# Altium integrated library Microchip Mixed Signal.IntLib: 1399 symbols (part 3 of 17)
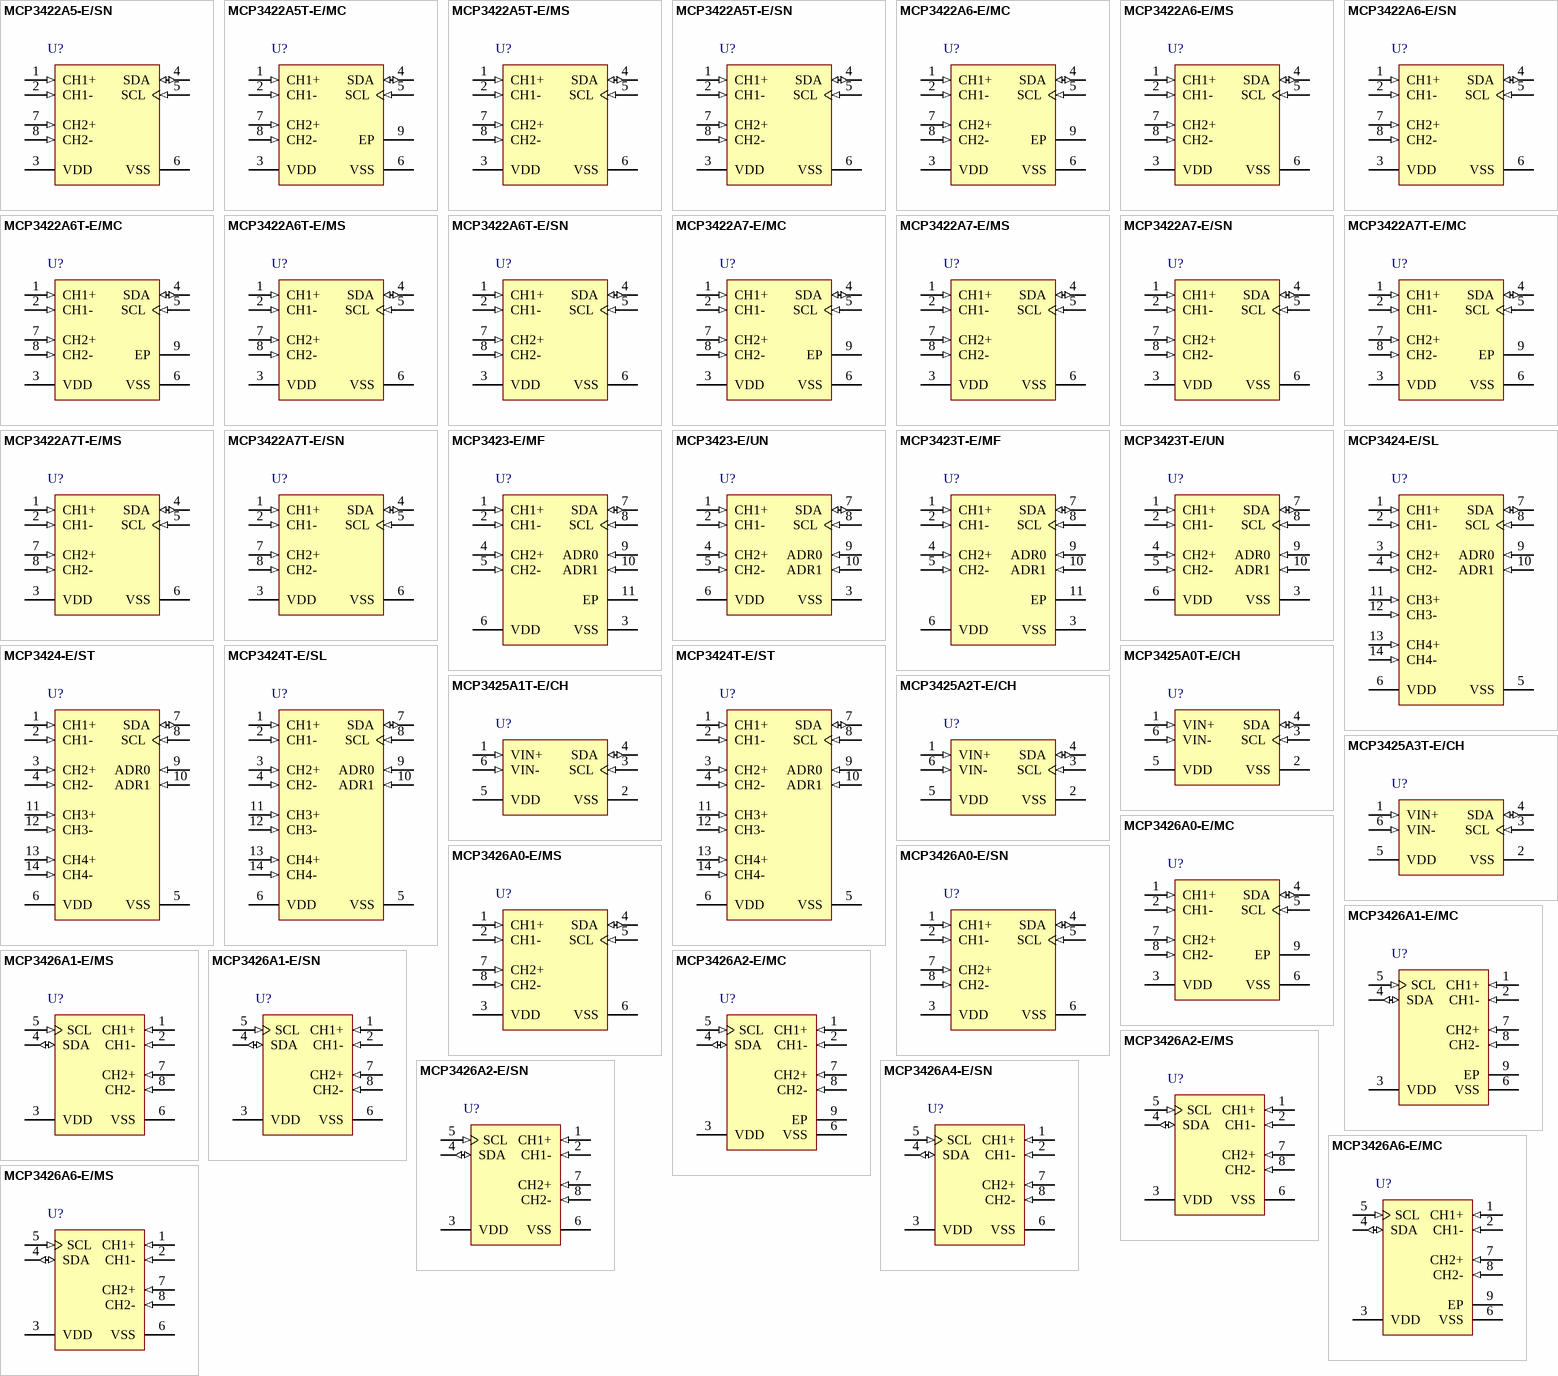
[diagram p46: symbols MCP3422A5-E/SN to MCP3426A6-E/MS]

## MCP3426A0-E/MS
designator U?
16-Bit, Multi-Channel Delta-Sigma Analog-to-Digital Converter with I2C Interface and On-Board Reference, 8-Pin MSOP, Extended Temperature; Manufacturer: Microchip; PartNumber: MCP3426A0-E/MS; DatasheetVersion: revA, Dec-2009; PackageVersion: revBB, Aug-2009; PackageReference: MSOP-MS8; PackageDescription: 8-Lead Plastic Micro Small Outline Package (MS) [MSOP]; Supplier 1: Digi-Key; Supplier Part Number 1: MCP3426A0-E/MS-ND; Mounting Technology: Surface Mount; ComponentLink1Description: Manufacturer URL; ComponentLink1URL: http://www.microchip.com/; ComponentLink2Description: Datasheet; ComponentLink2URL: http://ww1.microchip.com/downloads/en/DeviceDoc/22226a.pdf; ComponentLink3Description: Package Specification; ComponentLink3URL: http://www.microchip.com/stellent/groups/techpub_sg/documents/packagingspec/en012702.pdf
footprint MSOP-MS8_N (TSOP, 8-Leads, Body 3x3mm, Pitch 0.65mm, IPC Medium Density)
footprint MSOP-MS8_L (TSOP, 8-Leads, Body 3x3mm, Pitch 0.65mm, IPC High Density)
footprint MSOP-MS8_M (TSOP, 8-Leads, Body 3x3mm, Pitch 0.65mm, IPC Low Density)
pins: 1 CH1+ (in), 2 CH1- (in), 3 VDD (power), 4 SDA (io), 5 SCL (in), 6 VSS (power), 7 CH2+ (in), 8 CH2- (in)

## MCP3426A0-E/SN
designator U?
16-Bit, Multi-Channel Delta-Sigma Analog-to-Digital Converter with I2C Interface and On-Board Reference, 8-Pin SOIC 150mil, Extended Temperature; Manufacturer: Microchip; PartNumber: MCP3426A0-E/SN; DatasheetVersion: revA, Dec-2009; PackageVersion: revBB, Aug-2009; PackageReference: SOIC-SN8; PackageDescription: 8-Lead Plastic Small Outline (SN) - Narrow, 3.90mm Body [SOIC]; Supplier 1: Digi-Key; Supplier Part Number 1: MCP3426A0-E/SN-ND; Mounting Technology: Surface Mount; Code_JEDEC: MS-012; Code_IPC: SOIC127P600-8; ComponentLink1Description: Manufacturer URL; ComponentLink1URL: http://www.microchip.com/; ComponentLink2Description: Datasheet; ComponentLink2URL: http://ww1.microchip.com/downloads/en/DeviceDoc/22226a.pdf; ComponentLink3Description: Package Specification; ComponentLink3URL: http://www.microchip.com/stellent/groups/techpub_sg/documents/packagingspec/en012702.pdf
footprint SOIC-SN8_N (SOIC, 8-Leads, Body 4.9x3.8mm, Pitch 1.27mm, IPC Medium Density)
footprint SOIC-SN8_L (SOIC, 8-Leads, Body 4.9x3.8mm, Pitch 1.27mm, IPC High Density)
footprint SOIC-SN8_M (SOIC, 8-Leads, Body 4.9x3.8mm, Pitch 1.27mm, IPC Low Density)
pins: 1 CH1+ (in), 2 CH1- (in), 3 VDD (power), 4 SDA (io), 5 SCL (in), 6 VSS (power), 7 CH2+ (in), 8 CH2- (in)

## MCP3426A1-E/MC
designator U?
16-Bit, Multi-Channel delta sigma Analog-to-Digital Converter with I2C™ Interface and On-Board Reference, 145 uA, 2.7 to 5.5 V, -40 to 125 degC, 8-pin DFN (MC8), Tube; Manufacturer: Microchip; PartNumber: MCP3426A1-E/MC; DatasheetVersion: Rev. A; PackageVersion: C04-123C; PackageReference: DFN-MC8; PackageDescription: 8-Lead Plastic Dual Flat, 2 x 3 mm Body, 0.5 mm Pitch; Supplier 1: Digi-Key; Supplier Part Number 1: MCP3426A1-E/MC-ND; Mounting Technology: Surface Mount; ComponentLink1Description: Manufacturer URL; ComponentLink1URL: http://www.microchip.com; ComponentLink2Description: Datasheet; ComponentLink2URL: http://ww1.microchip.com/downloads/en/DeviceDoc/22226a.pdf; ComponentLink3Description: Package Specification; ComponentLink3URL: http://www.microchip.com/stellent/groups/techpub_sg/documents/packagingspec/en012702.pdf; ComponentLink4Description: Product URL; ComponentLink4URL: http://www.microchip.com/MCP3426
footprint MCHP-DFN-MC8_V (SON, 8-Leads, Body 3x2mm, Pitch 0.5mm, Thermal Pad 1.45x1.75mm)
pins: 1 CH1+ (in) "Positive Differential Analog Input Pin of Channel 1", 2 CH1- (in) "Negative Differential Analog Input Pin of Channel 1", 3 VDD (power) "Positive Supply Voltage Pin", 4 SDA (io) "Bidirectional Serial Data Pin of the I2C Interface", 5 SCL (in) "Serial Clock Pin of the I2C Interface", 6 VSS (power) "Ground Pin", 7 CH2+ (in) "Positive Differential Analog Input Pin of Channel 2", 8 CH2- (in) "Negative Differential Analog Input Pin of Channel 2", 9 EP (power) "Exposed Thermal Pad (EP); must be connected to VSS"

## MCP3426A1-E/MS
designator U?
16-Bit, Multi-Channel sigma delta Analog-to-Digital Converter with I2C™ Interface and On-Board Reference, 145 uA, 2.7 to 5.5 V, -40 to 125 degC, 8-pin MSOP (MS8), Tube; Manufacturer: Microchip; PartNumber: MCP3426A1-E/MS; DatasheetVersion: Rev. A; PackageVersion: C04-111C; PackageReference: MSOP-MS8; PackageDescription: 8-Lead Plastic Micro Small Outline Package, 3 x 3 mm Body, 0.65 mm Pitch; Supplier 1: Digi-Key; Supplier Part Number 1: MCP3426A1-E/MS-ND; Mounting Technology: Surface Mount; ComponentLink1Description: Manufacturer URL; ComponentLink1URL: http://www.microchip.com; ComponentLink2Description: Datasheet; ComponentLink2URL: http://ww1.microchip.com/downloads/en/DeviceDoc/22226a.pdf; ComponentLink3Description: Package Specification; ComponentLink3URL: http://www.microchip.com/stellent/groups/techpub_sg/documents/packagingspec/en012702.pdf; ComponentLink4Description: Product URL; ComponentLink4URL: http://www.microchip.com/MCP3426
footprint MCHP-MSOP-MS8_N (SOP, 8-Leads, Body 3x3mm, Pitch 0.65mm, IPC Medium Density)
footprint MCHP-MSOP-MS8_L (SOP, 8-Leads, Body 3x3mm, Pitch 0.65mm, IPC High Density)
footprint MCHP-MSOP-MS8_M (SOP, 8-Leads, Body 3x3mm, Pitch 0.65mm, IPC Low Density)
pins: 1 CH1+ (in) "Positive Differential Analog Input Pin of Channel 1", 2 CH1- (in) "Negative Differential Analog Input Pin of Channel 1", 3 VDD (power) "Positive Supply Voltage Pin", 4 SDA (io) "Bidirectional Serial Data Pin of the I2C Interface", 5 SCL (in) "Serial Clock Pin of the I2C Interface", 6 VSS (power) "Ground Pin", 7 CH2+ (in) "Positive Differential Analog Input Pin of Channel 2", 8 CH2- (in) "Negative Differential Analog Input Pin of Channel 2"

## MCP3426A1-E/SN
designator U?
16-Bit, Multi-Channel sigma delta Analog-to-Digital Converter with I2C™ Interface and On-Board Reference, 145 uA, 2.7 to 5.5 V, -40 to 125 degC, 8-pin SOIC (SN8), Tube; Manufacturer: Microchip; PartNumber: MCP3426A1-E/SN; DatasheetVersion: Rev. A; PackageVersion: C04-057C; PackageReference: SOIC-SN8; PackageDescription: 8-Lead Plastic Small Outline, 4.9 x 3.9 mm Body, 1.27 mm Pitch; Supplier 1: Digi-Key; Supplier Part Number 1: MCP3426A1-E/SN-ND; Mounting Technology: Surface Mount; ComponentLink1Description: Manufacturer URL; ComponentLink1URL: http://www.microchip.com; ComponentLink2Description: Datasheet; ComponentLink2URL: http://ww1.microchip.com/downloads/en/DeviceDoc/22226a.pdf; ComponentLink3Description: Package Specification; ComponentLink3URL: http://www.microchip.com/stellent/groups/techpub_sg/documents/packagingspec/en012702.pdf; ComponentLink4Description: Product URL; ComponentLink4URL: http://www.microchip.com/MCP3426
footprint MCHP-SOIC-SN8_N (SOIC, 8-Leads, Body 4.9x3.9mm, Pitch 1.27mm, IPC Medium Density)
footprint MCHP-SOIC-SN8_L (SOIC, 8-Leads, Body 4.9x3.9mm, Pitch 1.27mm, IPC High Density)
footprint MCHP-SOIC-SN8_M (SOIC, 8-Leads, Body 4.9x3.9mm, Pitch 1.27mm, IPC Low Density)
pins: 1 CH1+ (in) "Positive Differential Analog Input Pin of Channel 1", 2 CH1- (in) "Negative Differential Analog Input Pin of Channel 1", 3 VDD (power) "Positive Supply Voltage Pin", 4 SDA (io) "Bidirectional Serial Data Pin of the I2C Interface", 5 SCL (in) "Serial Clock Pin of the I2C Interface", 6 VSS (power) "Ground Pin", 7 CH2+ (in) "Positive Differential Analog Input Pin of Channel 2", 8 CH2- (in) "Negative Differential Analog Input Pin of Channel 2"

## MCP3426A2-E/MC
designator U?
16-Bit, Multi-Channel sigma delta Analog-to-Digital Converter with I2C™ Interface and On-Board Reference, 145 uA, 2.7 to 5.5 V, -40 to 125 degC, 8-pin DFN (MC8), Tube; Manufacturer: Microchip; PartNumber: MCP3426A2-E/MC; DatasheetVersion: Rev. A; PackageVersion: C04-123C; PackageReference: DFN-MC8; PackageDescription: 8-Lead Plastic Dual Flat, 2 x 3 mm Body, 0.5 mm Pitch; Supplier 1: Digi-Key; Supplier Part Number 1: MCP3426A2-E/MC-ND; Mounting Technology: Surface Mount; ComponentLink1Description: Manufacturer URL; ComponentLink1URL: http://www.microchip.com; ComponentLink2Description: Datasheet; ComponentLink2URL: http://ww1.microchip.com/downloads/en/DeviceDoc/22226a.pdf; ComponentLink3Description: Package Specification; ComponentLink3URL: http://www.microchip.com/stellent/groups/techpub_sg/documents/packagingspec/en012702.pdf; ComponentLink4Description: Product URL; ComponentLink4URL: http://www.microchip.com/MCP3426
footprint MCHP-DFN-MC8_V (SON, 8-Leads, Body 3x2mm, Pitch 0.5mm, Thermal Pad 1.45x1.75mm)
pins: 1 CH1+ (in) "Positive Differential Analog Input Pin of Channel 1", 2 CH1- (in) "Negative Differential Analog Input Pin of Channel 1", 3 VDD (power) "Positive Supply Voltage Pin", 4 SDA (io) "Bidirectional Serial Data Pin of the I2C Interface", 5 SCL (in) "Serial Clock Pin of the I2C Interface", 6 VSS (power) "Ground Pin", 7 CH2+ (in) "Positive Differential Analog Input Pin of Channel 2", 8 CH2- (in) "Negative Differential Analog Input Pin of Channel 2", 9 EP (power) "Exposed Thermal Pad (EP); must be connected to VSS"

## MCP3426A2-E/MS
designator U?
16-Bit, Multi-Channel sigma delta Analog-to-Digital Converter with I2C™ Interface and On-Board Reference, 145 uA, 2.7 to 5.5 V, -40 to 125 degC, 8-pin MSOP (MS8), Tube; Manufacturer: Microchip; PartNumber: MCP3426A2-E/MS; DatasheetVersion: Rev. A; PackageVersion: C04-111C; PackageReference: MSOP-MS8; PackageDescription: 8-Lead Plastic Micro Small Outline Package, 3 x 3 mm Body, 0.65 mm Pitch; Supplier 1: Digi-Key; Supplier Part Number 1: MCP3426A2-E/MS-ND; Mounting Technology: Surface Mount; ComponentLink1Description: Manufacturer URL; ComponentLink1URL: http://www.microchip.com; ComponentLink2Description: Datasheet; ComponentLink2URL: http://ww1.microchip.com/downloads/en/DeviceDoc/22226a.pdf; ComponentLink3Description: Package Specification; ComponentLink3URL: http://www.microchip.com/stellent/groups/techpub_sg/documents/packagingspec/en012702.pdf; ComponentLink4Description: Product URL; ComponentLink4URL: http://www.microchip.com/MCP3426
footprint MCHP-MSOP-MS8_N (SOP, 8-Leads, Body 3x3mm, Pitch 0.65mm, IPC Medium Density)
footprint MCHP-MSOP-MS8_L (SOP, 8-Leads, Body 3x3mm, Pitch 0.65mm, IPC High Density)
footprint MCHP-MSOP-MS8_M (SOP, 8-Leads, Body 3x3mm, Pitch 0.65mm, IPC Low Density)
pins: 1 CH1+ (in) "Positive Differential Analog Input Pin of Channel 1", 2 CH1- (in) "Negative Differential Analog Input Pin of Channel 1", 3 VDD (power) "Positive Supply Voltage Pin", 4 SDA (io) "Bidirectional Serial Data Pin of the I2C Interface", 5 SCL (in) "Serial Clock Pin of the I2C Interface", 6 VSS (power) "Ground Pin", 7 CH2+ (in) "Positive Differential Analog Input Pin of Channel 2", 8 CH2- (in) "Negative Differential Analog Input Pin of Channel 2"

## MCP3426A2-E/SN
designator U?
16-Bit, Multi-Channel sigma delta Analog-to-Digital Converter with I2C™ Interface and On-Board Reference, 145 uA, 2.7 to 5.5 V, -40 to 125 degC, 8-pin SOIC (SN8), Tube; Manufacturer: Microchip; PartNumber: MCP3426A2-E/SN; DatasheetVersion: Rev. A; PackageVersion: C04-057C; PackageReference: SOIC-SN8; PackageDescription: 8-Lead Plastic Small Outline, 4.9 x 3.9 mm Body, 1.27 mm Pitch; Supplier 1: Digi-Key; Supplier Part Number 1: MCP3426A2-E/SN-ND; Mounting Technology: Surface Mount; ComponentLink1Description: Manufacturer URL; ComponentLink1URL: http://www.microchip.com; ComponentLink2Description: Datasheet; ComponentLink2URL: http://ww1.microchip.com/downloads/en/DeviceDoc/22226a.pdf; ComponentLink3Description: Package Specification; ComponentLink3URL: http://www.microchip.com/stellent/groups/techpub_sg/documents/packagingspec/en012702.pdf; ComponentLink4Description: Product URL; ComponentLink4URL: http://www.microchip.com/MCP3426
footprint MCHP-SOIC-SN8_N (SOIC, 8-Leads, Body 4.9x3.9mm, Pitch 1.27mm, IPC Medium Density)
footprint MCHP-SOIC-SN8_L (SOIC, 8-Leads, Body 4.9x3.9mm, Pitch 1.27mm, IPC High Density)
footprint MCHP-SOIC-SN8_M (SOIC, 8-Leads, Body 4.9x3.9mm, Pitch 1.27mm, IPC Low Density)
pins: 1 CH1+ (in) "Positive Differential Analog Input Pin of Channel 1", 2 CH1- (in) "Negative Differential Analog Input Pin of Channel 1", 3 VDD (power) "Positive Supply Voltage Pin", 4 SDA (io) "Bidirectional Serial Data Pin of the I2C Interface", 5 SCL (in) "Serial Clock Pin of the I2C Interface", 6 VSS (power) "Ground Pin", 7 CH2+ (in) "Positive Differential Analog Input Pin of Channel 2", 8 CH2- (in) "Negative Differential Analog Input Pin of Channel 2"

## MCP3426A4-E/SN
designator U?
16-Bit, Multi-Channel sigma delta Analog-to-Digital Converter with I2C™ Interface and On-Board Reference, 145 uA, 2.7 to 5.5 V, -40 to 125 degC, 8-pin SOIC (SN8), Tube; Manufacturer: Microchip; PartNumber: MCP3426A4-E/SN; DatasheetVersion: Rev. A; PackageVersion: C04-057C; PackageReference: SOIC-SN8; PackageDescription: 8-Lead Plastic Small Outline, 4.9 x 3.9 mm Body, 1.27 mm Pitch; Supplier 1: Digi-Key; Supplier Part Number 1: MCP3426A4-E/SN-ND; Mounting Technology: Surface Mount; ComponentLink1Description: Manufacturer URL; ComponentLink1URL: http://www.microchip.com; ComponentLink2Description: Datasheet; ComponentLink2URL: http://ww1.microchip.com/downloads/en/DeviceDoc/22226a.pdf; ComponentLink3Description: Package Specification; ComponentLink3URL: http://www.microchip.com/stellent/groups/techpub_sg/documents/packagingspec/en012702.pdf; ComponentLink4Description: Product URL; ComponentLink4URL: http://www.microchip.com/MCP3426
footprint MCHP-SOIC-SN8_N (SOIC, 8-Leads, Body 4.9x3.9mm, Pitch 1.27mm, IPC Medium Density)
footprint MCHP-SOIC-SN8_L (SOIC, 8-Leads, Body 4.9x3.9mm, Pitch 1.27mm, IPC High Density)
footprint MCHP-SOIC-SN8_M (SOIC, 8-Leads, Body 4.9x3.9mm, Pitch 1.27mm, IPC Low Density)
pins: 1 CH1+ (in) "Positive Differential Analog Input Pin of Channel 1", 2 CH1- (in) "Negative Differential Analog Input Pin of Channel 1", 3 VDD (power) "Positive Supply Voltage Pin", 4 SDA (io) "Bidirectional Serial Data Pin of the I2C Interface", 5 SCL (in) "Serial Clock Pin of the I2C Interface", 6 VSS (power) "Ground Pin", 7 CH2+ (in) "Positive Differential Analog Input Pin of Channel 2", 8 CH2- (in) "Negative Differential Analog Input Pin of Channel 2"

## MCP3426A6-E/MC
designator U?
16-Bit, Multi-Channel sigma delta Analog-to-Digital Converter with I2C™ Interface and On-Board Reference, 145 uA, 2.7 to 5.5 V, -40 to 125 degC, 8-pin DFN (MC8), Tube; Manufacturer: Microchip; PartNumber: MCP3426A6-E/MC; DatasheetVersion: Rev. A; PackageVersion: C04-123C; PackageReference: DFN-MC8; PackageDescription: 8-Lead Plastic Dual Flat, 2 x 3 mm Body, 0.5 mm Pitch; Supplier 1: Digi-Key; Supplier Part Number 1: MCP3426A6-E/MC-ND; Mounting Technology: Surface Mount; ComponentLink1Description: Manufacturer URL; ComponentLink1URL: http://www.microchip.com; ComponentLink2Description: Datasheet; ComponentLink2URL: http://ww1.microchip.com/downloads/en/DeviceDoc/22226a.pdf; ComponentLink3Description: Package Specification; ComponentLink3URL: http://www.microchip.com/stellent/groups/techpub_sg/documents/packagingspec/en012702.pdf; ComponentLink4Description: Product URL; ComponentLink4URL: http://www.microchip.com/MCP3426
footprint MCHP-DFN-MC8_V (SON, 8-Leads, Body 3x2mm, Pitch 0.5mm, Thermal Pad 1.45x1.75mm)
pins: 1 CH1+ (in) "Positive Differential Analog Input Pin of Channel 1", 2 CH1- (in) "Negative Differential Analog Input Pin of Channel 1", 3 VDD (power) "Positive Supply Voltage Pin", 4 SDA (io) "Bidirectional Serial Data Pin of the I2C Interface", 5 SCL (in) "Serial Clock Pin of the I2C Interface", 6 VSS (power) "Ground Pin", 7 CH2+ (in) "Positive Differential Analog Input Pin of Channel 2", 8 CH2- (in) "Negative Differential Analog Input Pin of Channel 2", 9 EP (power) "Exposed Thermal Pad (EP); must be connected to VSS"

## MCP3426A6-E/MS
designator U?
16-Bit, Multi-Channel sigma delta Analog-to-Digital Converter with I2C™ Interface and On-Board Reference, 145 uA, 2.7 to 5.5 V, -40 to 125 degC, 8-pin MSOP (MS8), Tube; Manufacturer: Microchip; PartNumber: MCP3426A6-E/MS; DatasheetVersion: Rev. A; PackageVersion: C04-111C; PackageReference: MSOP-MS8; PackageDescription: 8-Lead Plastic Micro Small Outline Package, 3 x 3 mm Body, 0.65 mm Pitch; Supplier 1: Digi-Key; Supplier Part Number 1: MCP3426A6-E/MS-ND; Mounting Technology: Surface Mount; ComponentLink1Description: Manufacturer URL; ComponentLink1URL: http://www.microchip.com; ComponentLink2Description: Datasheet; ComponentLink2URL: http://ww1.microchip.com/downloads/en/DeviceDoc/22226a.pdf; ComponentLink3Description: Package Specification; ComponentLink3URL: http://www.microchip.com/stellent/groups/techpub_sg/documents/packagingspec/en012702.pdf; ComponentLink4Description: Product URL; ComponentLink4URL: http://www.microchip.com/MCP3426
footprint MCHP-MSOP-MS8_N (SOP, 8-Leads, Body 3x3mm, Pitch 0.65mm, IPC Medium Density)
footprint MCHP-MSOP-MS8_L (SOP, 8-Leads, Body 3x3mm, Pitch 0.65mm, IPC High Density)
footprint MCHP-MSOP-MS8_M (SOP, 8-Leads, Body 3x3mm, Pitch 0.65mm, IPC Low Density)
pins: 1 CH1+ (in) "Positive Differential Analog Input Pin of Channel 1", 2 CH1- (in) "Negative Differential Analog Input Pin of Channel 1", 3 VDD (power) "Positive Supply Voltage Pin", 4 SDA (io) "Bidirectional Serial Data Pin of the I2C Interface", 5 SCL (in) "Serial Clock Pin of the I2C Interface", 6 VSS (power) "Ground Pin", 7 CH2+ (in) "Positive Differential Analog Input Pin of Channel 2", 8 CH2- (in) "Negative Differential Analog Input Pin of Channel 2"

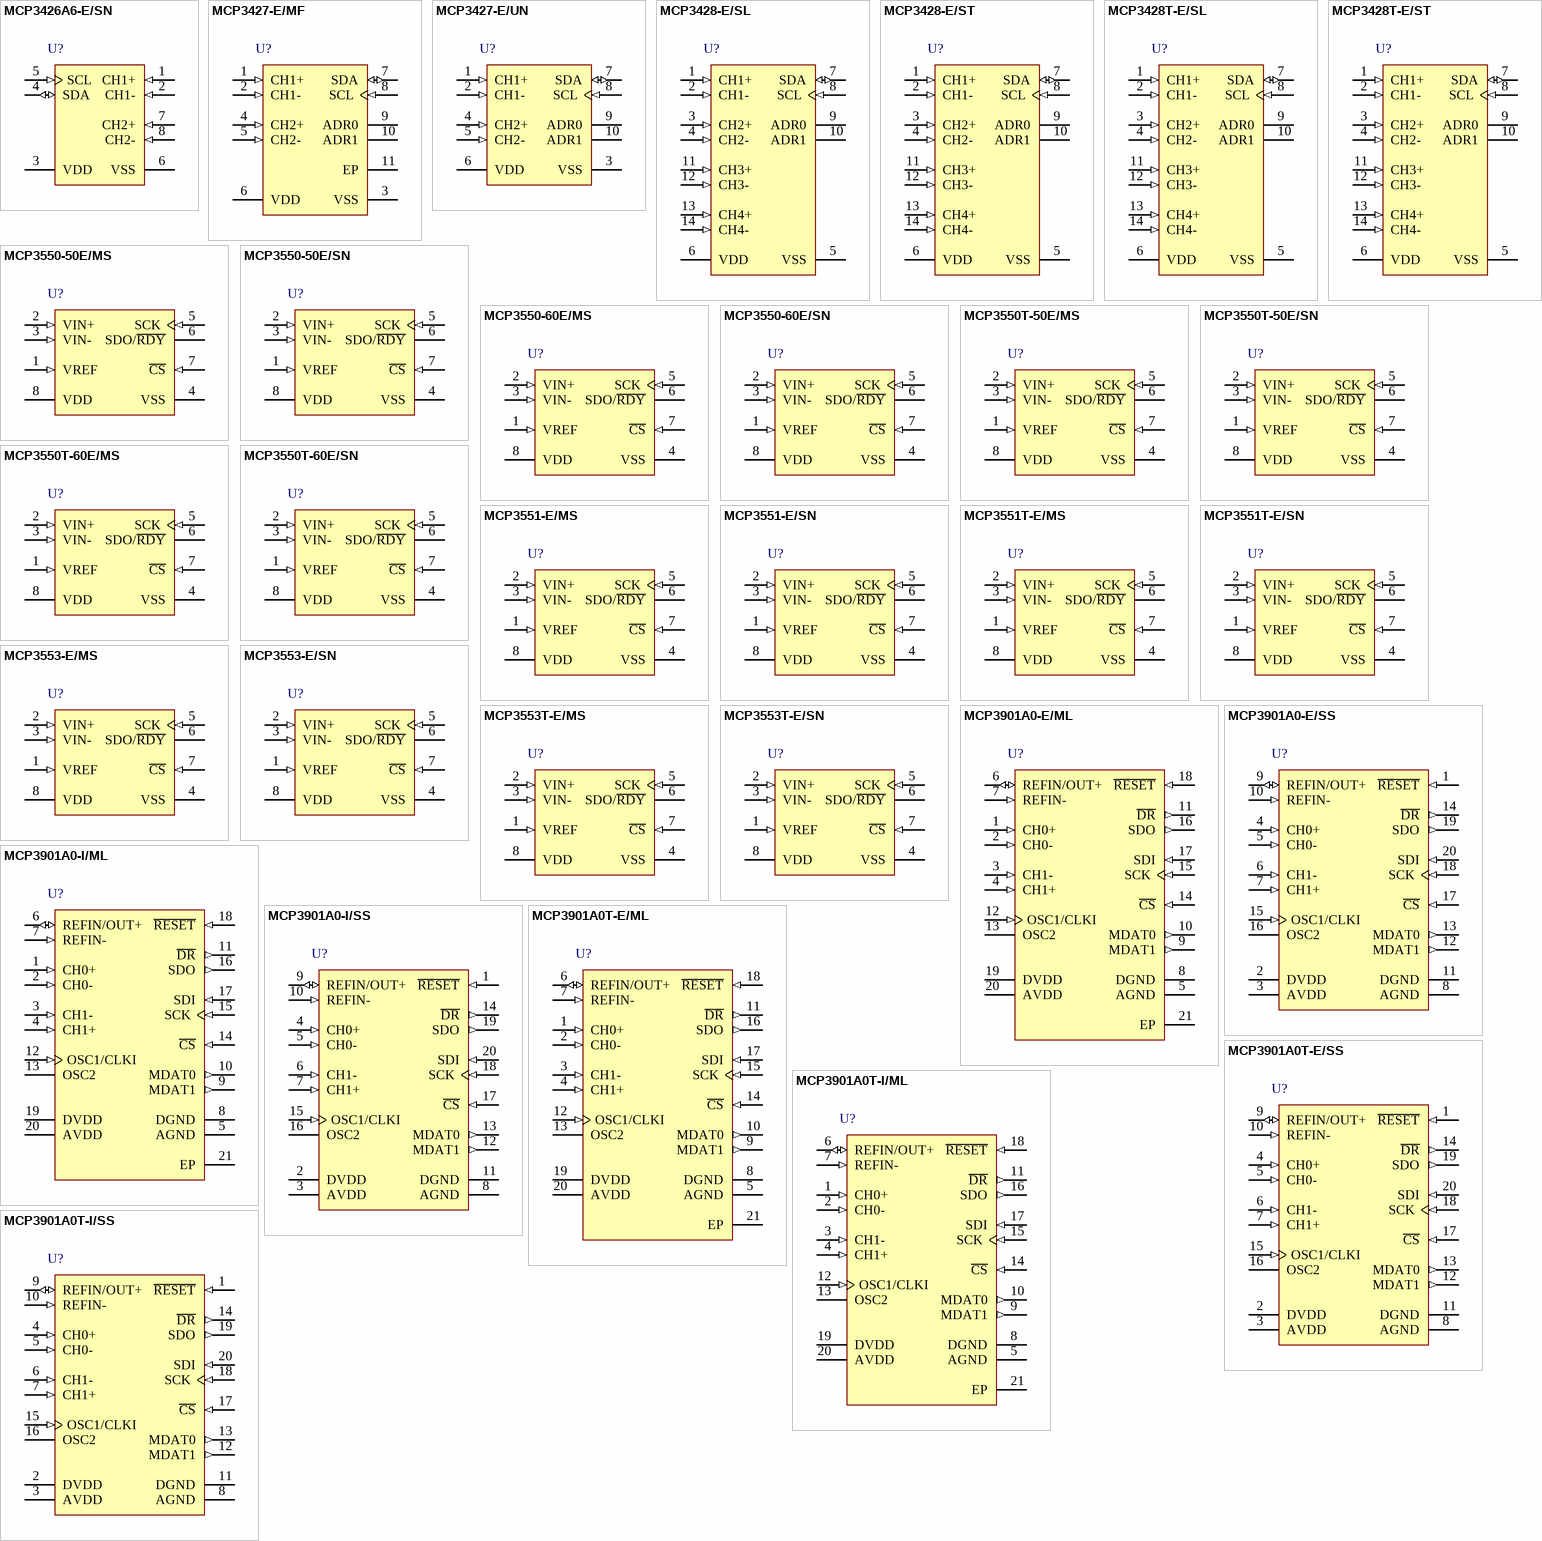
[diagram p5: symbols MCP3426A6-E/SN to MCP3901A0T-I/SS]

## MCP3426A6-E/SN
designator U?
16-Bit, Multi-Channel sigma delta Analog-to-Digital Converter with I2C™ Interface and On-Board Reference, 145 uA, 2.7 to 5.5 V, -40 to 125 degC, 8-pin SOIC (SN8), Tube; Manufacturer: Microchip; PartNumber: MCP3426A6-E/SN; DatasheetVersion: Rev. A; PackageVersion: C04-057C; PackageReference: SOIC-SN8; PackageDescription: 8-Lead Plastic Small Outline, 4.9 x 3.9 mm Body, 1.27 mm Pitch; Supplier 1: Digi-Key; Supplier Part Number 1: MCP3426A6-E/SN-ND; Mounting Technology: Surface Mount; ComponentLink1Description: Manufacturer URL; ComponentLink1URL: http://www.microchip.com; ComponentLink2Description: Datasheet; ComponentLink2URL: http://ww1.microchip.com/downloads/en/DeviceDoc/22226a.pdf; ComponentLink3Description: Package Specification; ComponentLink3URL: http://www.microchip.com/stellent/groups/techpub_sg/documents/packagingspec/en012702.pdf; ComponentLink4Description: Product URL; ComponentLink4URL: http://www.microchip.com/MCP3426
footprint MCHP-SOIC-SN8_N (SOIC, 8-Leads, Body 4.9x3.9mm, Pitch 1.27mm, IPC Medium Density)
footprint MCHP-SOIC-SN8_L (SOIC, 8-Leads, Body 4.9x3.9mm, Pitch 1.27mm, IPC High Density)
footprint MCHP-SOIC-SN8_M (SOIC, 8-Leads, Body 4.9x3.9mm, Pitch 1.27mm, IPC Low Density)
pins: 1 CH1+ (in) "Positive Differential Analog Input Pin of Channel 1", 2 CH1- (in) "Negative Differential Analog Input Pin of Channel 1", 3 VDD (power) "Positive Supply Voltage Pin", 4 SDA (io) "Bidirectional Serial Data Pin of the I2C Interface", 5 SCL (in) "Serial Clock Pin of the I2C Interface", 6 VSS (power) "Ground Pin", 7 CH2+ (in) "Positive Differential Analog Input Pin of Channel 2", 8 CH2- (in) "Negative Differential Analog Input Pin of Channel 2"